# Altium footprint library PcbLib.PcbLib: 16 footprints
Each footprint in its own frame and in the unit in brackets; x right, y up, seen from the top. Pads: shape width x height; smd on the part's side, far side on the other; paste and mask are expansions set on the pad; w line width, h text height; cw(c..) or ccw(c..) is an arc to the next point about the centre after c.
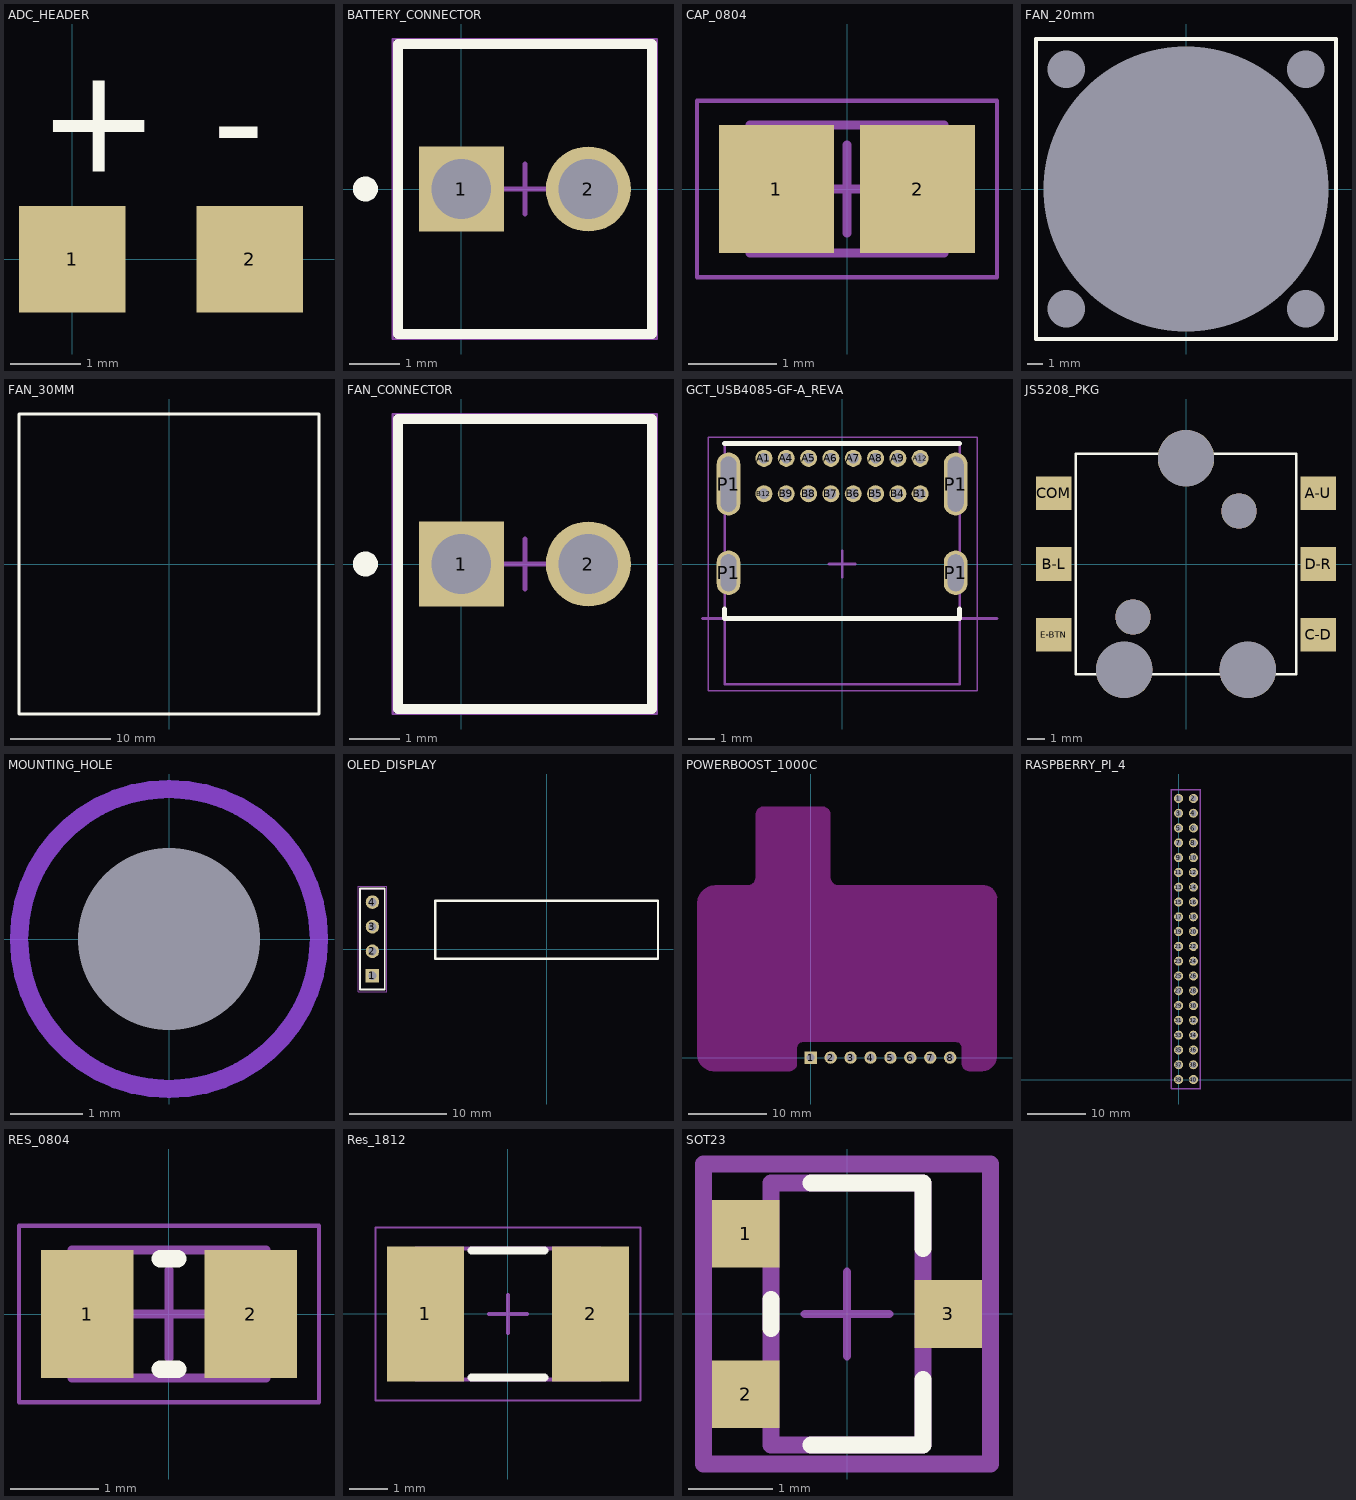
[diagram p0: the footprints below, top view; thin cyan lines are the x and y axes]

## ADC_HEADER [mil]
pads (2):
  rect 60x60 smd: 1(0,0) 2(100,0)
Top Overlay:
  text "+" at -19.53,49.22 h60
  text "-" at 78.9,48.91 h60

## BATTERY_CONNECTOR [mm]
height 1.8
pads (2):
  rect 1.7x1.7 hole 1.19: 1(0,0)
  round 1.7 hole 1.19: 2(2.54,0)
Top Overlay:
  circle w0.25: c-1.92,0 r0.125
  lines w0.2: -1.27,-2.9 -1.27,2.9 3.81,2.9 3.81,-2.9 -1.27,-2.9
Mechanical 13:
  lines w0.1: -1.27,-2.9 3.81,-2.9 3.81,2.9 -1.27,2.9 -1.27,-2.9
Mechanical 15:
  lines w0.05: -1.37,-3 -1.37,3 3.91,3 3.91,-3 -1.37,-3
  lines w0.1: 0.77,0 1.77,0 ; 1.27,-0.5 1.27,0.5
3D body "022272021.stp": height 11.72, standoff -3.54, extent -1.27,-2.9 3.81,2.9

## CAP_0804 [mm] "Chip Capacitor, 2-Leads, Body 2.00x1.25mm, IPC Medium Density"
height 0.88
pads (2):
  rect 1.3x1.45 smd: 1(-0.8,0) 2(0.8,0)
Mechanical 13:
  lines w0.1: -1.1,-0.725 -1.1,0.725 1.1,0.725 1.1,-0.725 -1.1,-0.725
Mechanical 15:
  lines w0.05: -1.7,-1 -1.7,1 1.7,1 1.7,-1 -1.7,-1
  lines w0.1: -0.5,0 0.5,0 ; 0,-0.5 0,0.5
3D body: height 0.88, standoff 0, extent -0.6,-0.725 0.6,0.725
3D body: height 0.88, standoff 0, extent -1.1,-0.725 -0.6,0.725
3D body: height 0.88, standoff 0, extent 0.6,-0.725 1.1,0.725

## FAN_20mm [mm]
pads (5):
  round 0 hole 2.5: 14(-8,-8) 14(-8,8) 14(8,-8) 14(8,8)
  round 0 hole 19: 14(0,0)
Top Layer keep-out:
  lines w0.254: -10,-10 10,-10 10,10 -10,10 -10,-10
Bottom Layer keep-out:
  lines w0.254: -10,-10 10,-10 10,10 -10,10 -10,-10
Top Overlay:
  lines w0.254: -10,-10 10,-10 10,10 -10,10 -10,-10
3D body "DC Fan 20x20x10.stp": height 10, standoff 0, extent -10,-10 10,10

## FAN_30MM [mm]
Top Overlay:
  lines w0.254: -15,-15 15,-15 15,15 -15,15 -15,-15
3D body "Fan 30mm.step": height 0, standoff -7, extent -15,-15 15,15

## FAN_CONNECTOR [mm]
height 1.8
pads (2):
  rect 1.7x1.7 hole 1.19: 1(0,0)
  round 1.7 hole 1.19: 2(2.54,0)
Top Overlay:
  circle w0.25: c-1.92,0 r0.125
  lines w0.2: -1.27,-2.9 -1.27,2.9 3.81,2.9 3.81,-2.9 -1.27,-2.9
Mechanical 13:
  lines w0.1: -1.27,-2.9 3.81,-2.9 3.81,2.9 -1.27,2.9 -1.27,-2.9
Mechanical 15:
  lines w0.05: -1.37,-3 -1.37,3 3.91,3 3.91,-3 -1.37,-3
  lines w0.1: 0.77,0 1.77,0 ; 1.27,-0.5 1.27,0.5
3D body "022272021.stp": height 11.72, standoff -3.54, extent -1.27,-2.9 3.81,2.9

## GCT_USB4085-GF-A_REVA [mm] "USB 2.0 Type C Receptacle Dip Type, PCB Top Mount"
height 3.46
pads (20):
  round 0.65 hole 0.4: A1(-2.975,4.025) A4(-2.125,4.025) A5(-1.275,4.025) A6(-0.425,4.025) A7(0.425,4.025) A8(1.275,4.025) A9(2.125,4.025) A12(2.975,4.025) B1(2.975,2.675) B4(2.125,2.675) B5(1.275,2.675) B6(0.425,2.675) B7(-0.425,2.675) B8(-1.275,2.675) B9(-2.125,2.675) B12(-2.975,2.675)
  oval 0.9x1.7 hole 0.6 slot 1.4 at 90 deg: P1(-4.325,-0.335) P1(4.325,-0.335)
  oval 0.9x2.4 hole 0.6 slot 2.1 at 90 deg: P1(-4.325,3.045) P1(4.325,3.045)
Top Overlay:
  lines w0.2: -4.475,-1.725 -4.475,-2.075 4.475,-2.075 4.475,-1.725 ; -4.475,4.585 4.475,4.585
Mechanical 13:
  lines w0.1: -4.475,-4.585 -4.475,4.585 4.475,4.585 4.475,-4.585 -4.475,-4.585
Mechanical 15:
  lines w0.05: -5.1,-4.825 -5.1,4.825 5.15,4.825 5.15,-4.825 -5.1,-4.825
  lines w0.1: -0.5,0 0.5,0 ; 0,-0.5 0,0.5
Top Component Center:
  lines w0.127: -5.3,-2.075 5.9,-2.075
  text ">PCB Edge" at 5.7,-2.075 h1.57
3D body "USB4085-03-A_revA.STEP": height 3.46, standoff -2.1, extent -4.515,-4.564 4.515,4.606

## HEATSINK [mm]
3D body "heatsink-top.step": height -0.3, standoff -15.7, extent -34.95,-27.825 35.05,27.775

## JS5208_PKG [mm]
pads (11):
  rect 2x1.9 smd: A-U(7.5,4) B-L(-7.5,0) C-D(7.5,-4) COM(-7.5,4) D-R(7.5,0) E-BTN(-7.5,-4)
  round 3.2 hole 3.2 unplated: ""(-3.5,-6) ""(0,6) ""(3.5,-6)
  round 2 hole 2 unplated: ""(-3,-3) ""(3,3)
Top Overlay:
  lines w0.127: -6.25,-6.25 -6.25,6.25 6.25,6.25 6.25,-6.25 -6.25,-6.25
3D body "JS5208--3DModel-STEP-56544.STEP": height 12.2, standoff -2.3, extent -8.2,-6.35 8.2,6.35

## MOUNTING_HOLE [mm]
pads (1):
  round 0 hole 2.5: 15(0,0)
Top Layer keep-out:
  circle w0.254: c0,0 r2.062
Bottom Layer keep-out:
  circle w0.254: c0,0 r2.062
3D body "TR Fastenings Ltd-M2X16MM.step": height 2, standoff -16, extent -1.9,-1.9 1.9,1.9

## OLED_DISPLAY [mm]
pads (4):
  rect 1.4x1.4 hole 0.86: 1(-18,-2.75)
  round 1.4 hole 0.86: 2(-18,-0.21) 3(-18,2.33) 4(-18,4.87)
Top Overlay:
  lines w0.2: -19.27,-4.145 -16.73,-4.145 -16.73,6.265 -19.27,6.265 -19.27,-4.145
  lines w0.254: -11.5,-1 -11.5,5 11.5,5 11.5,-1 -11.5,-1
Mechanical 13:
  lines w0.1: -19.27,-4.145 -19.27,6.265 -16.73,6.265 -16.73,-4.145 -19.27,-4.145
Mechanical 15:
  lines w0.05: -19.495,-4.37 -16.505,-4.37 -16.505,6.49 -19.495,6.49 -19.495,-4.37
3D body "User Library-OLED 32x 128.step": height 7.16, standoff -1.8, extent -19.45,-4.971 20.55,7.029
3D body "SLW-104-01-X-S.step": height 4.57, standoff -2.92, extent -19.27,-4.02 -16.73,6.14

## POWERBOOST_1000C [mm]
height 5
pads (8):
  rect 1.57x1.57 hole 1.02 paste-1000 mask+0: 1(0,0)
  round 1.57 hole 1.02 paste-1000 mask+0: 2(2.54,0) 3(5.08,0) 4(7.62,0) 5(10.16,0) 6(12.7,0) 7(15.24,0) 8(17.78,0)
Keep-Out Layer:
  board cut-out: -14.5,0.5 -14.5,19.5 -14.5,19.746 -14.404,20.229 -14.215,20.684 -13.942,21.094 -13.594,21.442 -13.184,21.715 -12.729,21.904 -12.246,22 -12,22 -8,22 -7.902,22.005 -7.71,22.043 -7.529,22.118 -7.366,22.227 -7.227,22.366 -7.118,22.529 -7.043,22.71 -7.005,22.902 -7,23 -7,31 -7,31.098 -6.962,31.292 -6.886,31.474 -6.777,31.637 -6.637,31.777 -6.474,31.886 -6.292,31.961 -6.099,32 -6,32 1.5,32 1.599,32 1.792,31.962 1.974,31.886 2.137,31.777 2.277,31.637 2.386,31.474 2.462,31.292 2.5,31.098 2.5,31 2.5,23 2.505,22.902 2.543,22.71 2.618,22.529 2.727,22.366 2.866,22.227 3.029,22.118 3.21,22.043 3.402,22.005 3.5,22 22,22 22.173,22 22.511,21.933 22.829,21.801 23.116,21.609 23.359,21.366 23.551,21.079 23.683,20.76 23.75,20.422 23.75,20.25 23.75,0.242 23.75,0.045 23.672,-0.343 23.52,-0.708 23.299,-1.036 23.018,-1.315 22.688,-1.532 22.321,-1.681 21.933,-1.754 21.735,-1.752 20.229,-1.737 20.133,-1.736 19.943,-1.696 19.765,-1.621 19.604,-1.512 19.468,-1.375 19.361,-1.213 19.288,-1.034 19.25,-0.844 19.25,-0.747 19.25,1.25 19.236,1.396 19.124,1.667 18.917,1.874 18.646,1.986 18.5,2 -1,2 -1.146,1.986 -1.417,1.874 -1.624,1.667 -1.736,1.396 -1.75,1.25 -1.75,-0.75 -1.75,-0.847 -1.788,-1.037 -1.862,-1.216 -1.969,-1.377 -2.106,-1.514 -2.267,-1.621 -2.446,-1.696 -2.636,-1.733 -2.733,-1.733 -12.267,-1.733 -12.487,-1.733 -12.918,-1.647 -13.325,-1.479 -13.69,-1.235 -14.001,-0.924 -14.246,-0.558 -14.414,-0.152 -14.5,0.28
3D body "SuperBoost1000C.stp": height 3.86, standoff -2.53, extent -13.425,-1.25 23.205,21.61
3D body "Conn_Samtec_TSW-108-08-G-S_eec.STEP": height 8.71, standoff -5.08, extent -1.397,-1.27 19.05,1.27

## RASPBERRY_PI_4 [mm] "Board-to-Board Connector, PC104 CD ISA, Stackthrough, Vertical, 2-Row, 40-Postion, Pitch 2.54mm, Receptacle"
height 11.05
pads (40):
  round 1.55 hole 1.05: 1(0,48.26) 2(2.54,48.26) 3(0,45.72) 4(2.54,45.72) 5(0,43.18) 6(2.54,43.18) 7(0,40.64) 8(2.54,40.64) 9(0,38.1) 10(2.54,38.1) 11(0,35.56) 12(2.54,35.56) 13(0,33.02) 14(2.54,33.02) 15(0,30.48) 16(2.54,30.48) 17(0,27.94) 18(2.54,27.94) 19(0,25.4) 20(2.54,25.4) 21(0,22.86) 22(2.54,22.86) 23(0,20.32) 24(2.54,20.32) 25(0,17.78) 26(2.54,17.78) 27(0,15.24) 28(2.54,15.24) 29(0,12.7) 30(2.54,12.7) 31(0,10.16) 32(2.54,10.16) 33(0,7.62) 34(2.54,7.62) 35(0,5.08) 36(2.54,5.08) 37(0,2.54) 38(2.54,2.54) 39(0,0) 40(2.54,0)
Bottom Overlay:
  lines w0.2: -1.205,-1.525 -1.205,49.785 3.745,49.785 3.745,-1.525 -1.205,-1.525
Mechanical 13:
  lines w0.1: -1.205,-1.525 3.745,-1.525 3.745,49.785 -1.205,49.785 -1.205,-1.525
Mechanical 15:
  lines w0.1: 2.04,2.54 3.04,2.54 ; 2.54,2.04 2.54,3.04 ; -1.305,-1.625 3.845,-1.625 3.845,49.885 -1.305,49.885 -1.305,-1.625
3D body "Raspberry Pi 4 Model B.STEP": height 5, standoff -14.9, extent -53.641,-32.266 4.759,56.724
3D body: height 2.65, standoff -12.19, extent -0.32,-0.32 0.32,0.32
3D body: height 2.65, standoff -12.19, extent 2.22,-0.32 2.86,0.32
3D body: height 2.65, standoff -12.19, extent 2.22,2.22 2.86,2.86
3D body: height 2.65, standoff -12.19, extent 2.22,4.76 2.86,5.4
3D body: height 2.65, standoff -12.19, extent 2.22,7.3 2.86,7.94
3D body: height 2.65, standoff -12.19, extent 2.22,9.84 2.86,10.48
3D body: height 2.65, standoff -12.19, extent 2.22,12.38 2.86,13.02
3D body: height 2.65, standoff -12.19, extent 2.22,14.92 2.86,15.56
3D body: height 2.65, standoff -12.19, extent 2.22,17.46 2.86,18.1
3D body: height 2.65, standoff -12.19, extent 2.22,20 2.86,20.64
3D body: height 2.65, standoff -12.19, extent 2.22,22.54 2.86,23.18
3D body: height 2.65, standoff -12.19, extent 2.22,25.08 2.86,25.72
3D body: height 2.65, standoff -12.19, extent 2.22,27.62 2.86,28.26
3D body: height 2.65, standoff -12.19, extent 2.22,30.16 2.86,30.8
3D body: height 2.65, standoff -12.19, extent 2.22,32.7 2.86,33.34
3D body: height 2.65, standoff -12.19, extent 2.22,35.24 2.86,35.88
3D body: height 2.65, standoff -12.19, extent 2.22,37.78 2.86,38.42
3D body: height 2.65, standoff -12.19, extent 2.22,40.32 2.86,40.96
3D body: height 2.65, standoff -12.19, extent 2.22,42.86 2.86,43.5
3D body: height 2.65, standoff -12.19, extent 2.22,45.4 2.86,46.04
3D body: height 2.65, standoff -12.19, extent 2.22,47.94 2.86,48.58
3D body: height 2.65, standoff -12.19, extent -0.32,2.22 0.32,2.86
3D body: height 2.65, standoff -12.19, extent -0.32,4.76 0.32,5.4
3D body: height 2.65, standoff -12.19, extent -0.32,7.3 0.32,7.94
3D body: height 2.65, standoff -12.19, extent -0.32,9.84 0.32,10.48
3D body: height 2.65, standoff -12.19, extent -0.32,12.38 0.32,13.02
3D body: height 2.65, standoff -12.19, extent -0.32,14.92 0.32,15.56
3D body: height 2.65, standoff -12.19, extent -0.32,17.46 0.32,18.1
3D body: height 2.65, standoff -12.19, extent -0.32,20 0.32,20.64
3D body: height 2.65, standoff -12.19, extent -0.32,22.54 0.32,23.18
3D body: height 2.65, standoff -12.19, extent -0.32,25.08 0.32,25.72
3D body: height 2.65, standoff -12.19, extent -0.32,27.62 0.32,28.26
3D body: height 2.65, standoff -12.19, extent -0.32,30.16 0.32,30.8
3D body: height 2.65, standoff -12.19, extent -0.32,32.7 0.32,33.34
3D body: height 2.65, standoff -12.19, extent -0.32,35.24 0.32,35.88
3D body: height 2.65, standoff -12.19, extent -0.32,37.78 0.32,38.42
3D body: height 2.65, standoff -12.19, extent -0.32,40.32 0.32,40.96
3D body: height 2.65, standoff -12.19, extent -0.32,42.86 0.32,43.5
3D body: height 2.65, standoff -12.19, extent -0.32,45.4 0.32,46.04
3D body: height 2.65, standoff -12.19, extent -0.32,47.94 0.32,48.58
3D body: height 8.4, standoff 0, extent -1.205,-1.6 3.745,49.86

## RES_0804 [mm] "Chip Resistor, 2-Leads, Body 2.00x1.25mm, IPC Medium Density"
height 0.5
pads (2):
  rect 1.05x1.45 smd: 1(-0.925,0) 2(0.925,0)
Top Overlay:
  lines w0.2: -0.1,-0.625 0.1,-0.625 ; -0.1,0.625 0.1,0.625
Mechanical 13:
  lines w0.1: -1.1,-0.725 1.1,-0.725 1.1,0.725 -1.1,0.725 -1.1,-0.725
Mechanical 15:
  lines w0.05: -1.7,-1 1.7,-1 1.7,1 -1.7,1 -1.7,-1
  lines w0.1: -0.5,0 0.5,0 ; 0,-0.5 0,0.5
3D body: height 0.5, standoff 0, extent 0.8,-0.725 1.1,0.725
3D body: height 0.5, standoff 0, extent -1.1,-0.725 -0.8,0.725
3D body: height 0.5, standoff 0, extent -0.8,-0.725 0.8,0.725

## Res_1812 [mm] "Chip Capacitor, Body 4.5x3.2mm, Height 1.25mm, IPC Low Density"
height 1.25
pads (2):
  rect 2x3.5 smd: 1(-2.15,0) 2(2.15,0)
Top Overlay:
  lines w0.2: -0.95,-1.65 0.95,-1.65 ; -0.95,1.65 0.95,1.65
Mechanical 13:
  lines w0.1: -2.4,-1.7 2.4,-1.7 2.4,1.7 -2.4,1.7 -2.4,-1.7
Mechanical 15:
  lines w0.05: -3.45,-2.25 3.45,-2.25 3.45,2.25 -3.45,2.25 -3.45,-2.25
  lines w0.1: -0.5,0 0.5,0 ; 0,-0.5 0,0.5
3D body: height 1.25, standoff 0, extent 1.8,-1.7 2.4,1.7
3D body: height 1.25, standoff 0, extent -2.4,-1.7 -1.8,1.7
3D body: height 1.25, standoff 0, extent -1.8,-1.7 1.8,1.7

## SOT23 [mm]
height 5.6
pads (3):
  rect 0.8x0.8 smd paste+0 mask+0: 1(-1.2,0.95) 2(-1.2,-0.95) 3(1.2,0)
Top Overlay:
  lines w0.2: -0.9,-0.175 -0.9,0.175 ; -0.425,-1.55 0.9,-1.55 0.9,-0.775 ; -0.425,1.55 0.9,1.55 0.9,0.775
Top 3D Body:
  lines w0.2: -0.9,-1.55 0.9,-1.55 0.9,1.55 -0.9,1.55 -0.9,-1.55
Top Courtyard:
  lines w0.2: -1.7,-1.777 1.7,-1.777 1.7,1.777 -1.7,1.777 -1.7,-1.777
Top Assembly:
  lines w0.2: -1.7,-1.777 1.7,-1.777 1.7,1.777 -1.7,1.777 -1.7,-1.777
  text ".Designator" at 0,-0.001 h1
Top Component Center:
  lines w0.1: -0.5,0 0.5,0 ; 0,-0.5 0,0.5
3D body "Trans_Alpha_&_Omega_Semiconductor_AO3400A_eec.STEP": height 0.25, standoff 0, extent -1.7,-1.777 1.7,1.777